# Altium footprint library RF Module.PcbLib: 16 footprints
Each footprint in its own frame and in the unit in brackets; x right, y up, seen from the top. Pads: shape width x height; smd on the part's side, far side on the other; paste and mask are expansions set on the pad; w line width, h text height; cw(c..) or ccw(c..) is an arc to the next point about the centre after c.
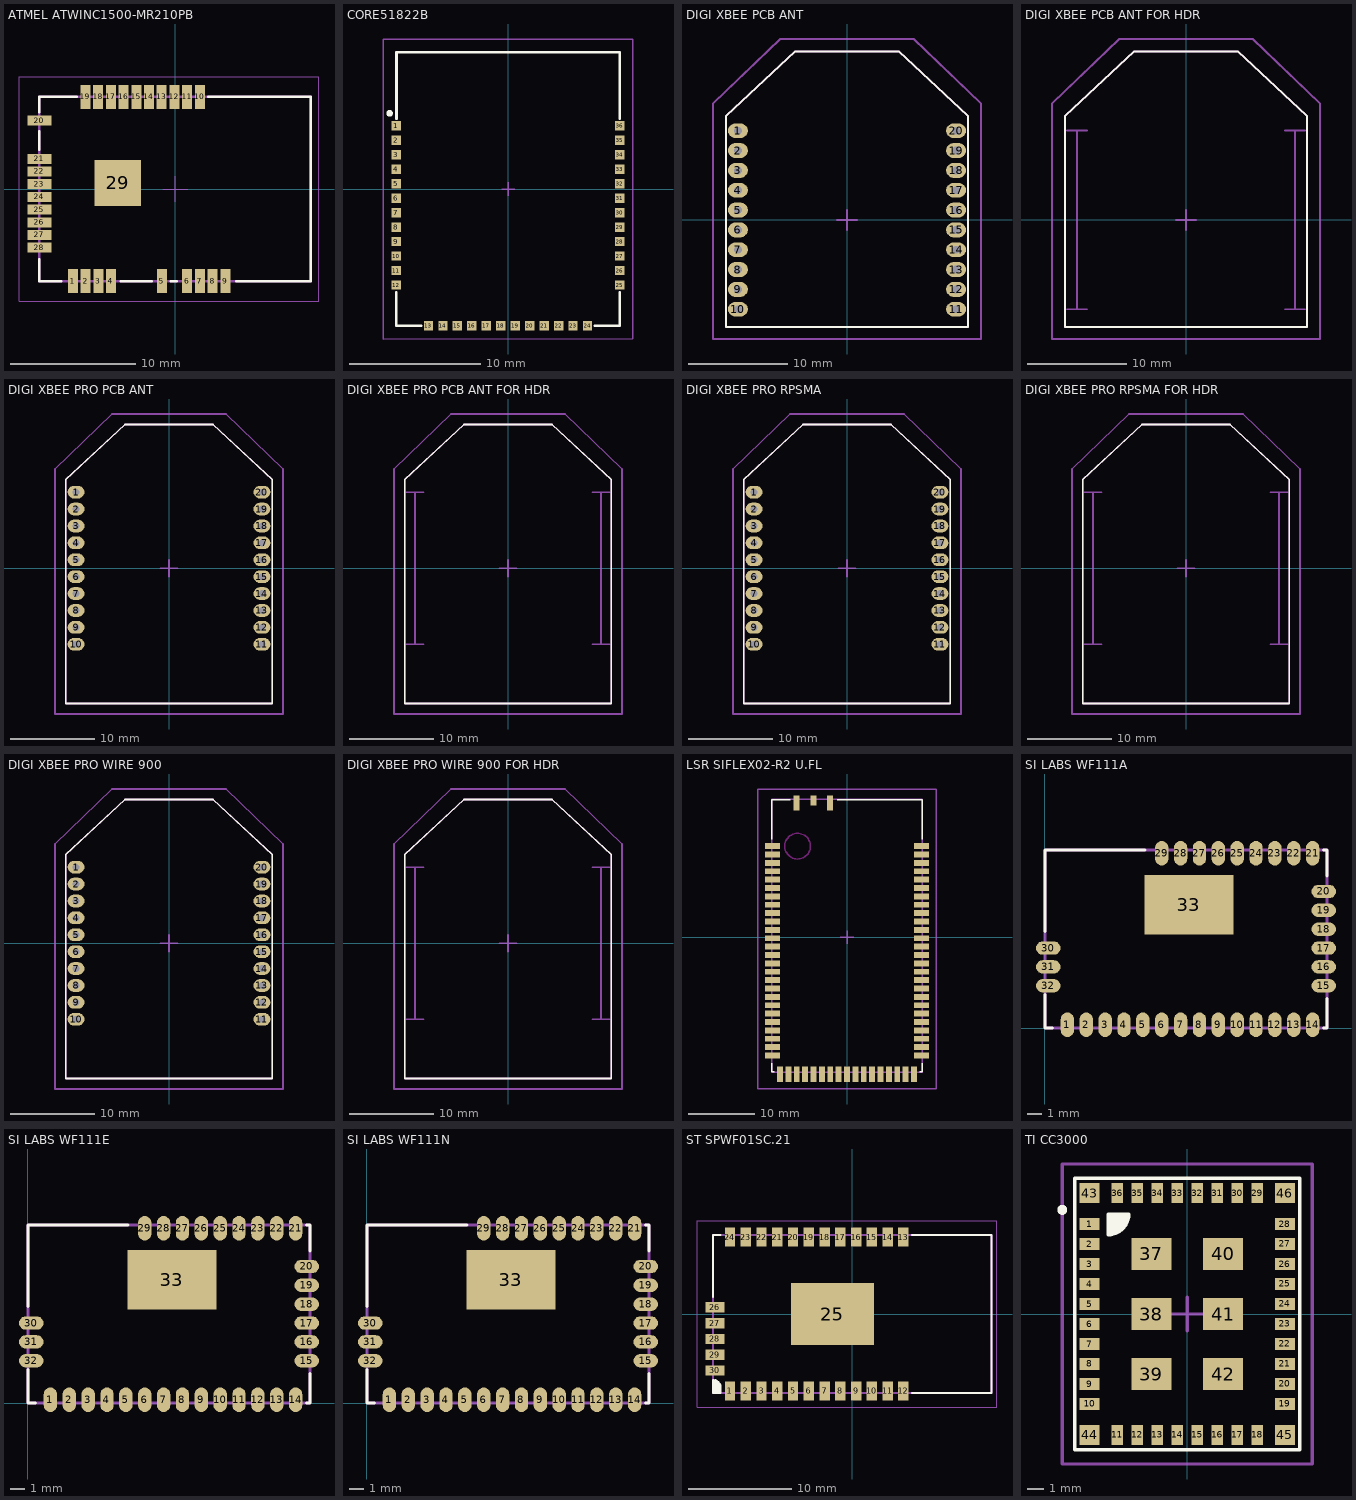
[diagram p0: the footprints below, top view; thin cyan lines are the x and y axes]

## ATMEL ATWINC1500-MR210PB [mm]
height 2.2
pads (29):
  rect 0.8x1.9 smd: 1(-8.19,-7.365) 2(-7.174,-7.365) 3(-6.158,-7.365) 4(-5.142,-7.365) 5(-1.078,-7.365) 6(0.954,-7.365) 7(1.97,-7.365) 8(2.986,-7.365) 9(4.002,-7.365) 10(1.964,7.365) 11(0.948,7.365) 12(-0.068,7.365) 13(-1.084,7.365) 14(-2.1,7.365) 15(-3.116,7.365) 16(-4.132,7.365) 17(-5.148,7.365) 18(-6.164,7.365) 19(-7.18,7.365)
  rect 1.9x0.8 smd: 20(-10.86,5.465) 21(-10.86,2.417) 22(-10.86,1.401) 23(-10.86,0.385) 24(-10.86,-0.631) 25(-10.86,-1.647) 26(-10.86,-2.663) 27(-10.86,-3.679) 28(-10.86,-4.695)
  rect 3.7x3.7 smd: 29(-4.59,0.485)
Top Overlay:
  lines w0.2: -10.86,-5.615 -10.86,-7.365 -9.11,-7.365 ; -10.86,3.135 -10.86,4.635 ; -10.86,6.135 -10.86,7.365 -7.86,7.365 ; -4.36,-7.365 -1.86,-7.365 ; -0.36,-7.365 0.14,-7.365 ; 2.64,7.365 10.86,7.365 10.86,-7.365 4.89,-7.365
Mechanical 1:
  lines w0.2: -10.86,-7.365 10.86,-7.365 10.86,7.365 -10.86,7.365 -10.86,-7.365
Mechanical 15:
  lines w0.1: -1,0 1,0 ; 0,-1 0,1 ; -12.5,-9 -12.5,9 11.5,9 11.5,-9 -12.5,-9
3D body "ATWINC1500-MR210PB.STEP": height 2.2, standoff 0, extent -10.86,-7.365 10.86,7.365

## CORE51822B [mm] "BLE4.0 Bluetooth 2.4G Wireless Module"
height 3
pads (36):
  rect 0.7x0.7 smd: 1(-8.525,4.8) 2(-8.525,3.7) 3(-8.525,2.6) 4(-8.525,1.5) 5(-8.525,0.4) 6(-8.525,-0.7) 7(-8.525,-1.8) 8(-8.525,-2.9) 9(-8.525,-4) 10(-8.525,-5.1) 11(-8.525,-6.2) 12(-8.525,-7.3) 13(-6.075,-10.4) 14(-4.975,-10.4) 15(-3.875,-10.4) 16(-2.775,-10.4) 17(-1.675,-10.4) 18(-0.575,-10.4) 19(0.525,-10.4) 20(1.625,-10.4) 21(2.725,-10.4) 22(3.825,-10.4) 23(4.925,-10.4) 24(6.025,-10.4) 25(8.475,-7.3) 26(8.475,-6.2) 27(8.475,-5.1) 28(8.475,-4) 29(8.475,-2.9) 30(8.475,-1.8) 31(8.475,-0.7) 32(8.475,0.4) 33(8.475,1.5) 34(8.475,2.6) 35(8.475,3.7) 36(8.475,4.8)
Top Overlay:
  circle w0.254: c-9.025,5.75 r0.125
  lines w0.2: -8.525,-7.85 -8.525,-10.4 -6.625,-10.4 ; -8.5,5.35 -8.5,10.4 8.475,10.4 8.475,5.35 ; 6.575,-10.4 8.475,-10.4 8.475,-7.85
Mechanical 15:
  lines w0.1: -0.5,0 0.5,0 ; 0,-0.5 0,0.5 ; -9.525,-11.4 9.475,-11.4 9.475,11.4 -9.525,11.4 -9.525,-11.4
3D body: height 2.5, standoff 0, extent -8.525,-10.4 8.475,10.4

## DIGI XBEE PCB ANT [mm]
height 4
pads (20):
  oval 2x1.5 hole 0.8: 1(-11,9) 2(-11,7) 3(-11,5) 4(-11,3) 5(-11,1) 6(-11,-1) 7(-11,-3) 8(-11,-5) 9(-11,-7) 10(-11,-9) 11(11,-9) 12(11,-7) 13(11,-5) 14(11,-3) 15(11,-1) 16(11,1) 17(11,3) 18(11,5) 19(11,7) 20(11,9)
Top Overlay:
  lines w0.2: -12.2,-10.8 0,-10.8 12.2,-10.8 12.2,10.5 5.2,17 0,17 -5.2,17 -12.2,10.5 -12.2,-10.8
Mechanical 1:
  lines w0.2: -12.2,-10.8 -12.2,10.5 -5.2,17 0,17 5.2,17 12.2,10.5 12.2,-10.8 0,-10.8 -12.2,-10.8
Mechanical 15:
  lines w0.2: -1,0 1,0 ; 0,-1 0,1 ; -13.5,-12 -13.5,11.75 -6.75,18.25 6.75,18.25 13.5,11.75 13.5,-12 -13.5,-12
3D body "XBee PCB Antenna.STEP": height 3.58, standoff -4.17, extent -12.192,-10.8 12.192,16.97

## DIGI XBEE PCB ANT FOR HDR [mm]
height 8.4
Top Overlay:
  lines w0.2: -12.2,-10.8 0,-10.8 12.2,-10.8 12.2,10.5 5.2,17 0,17 -5.2,17 -12.2,10.5 -12.2,-10.8
Mechanical 1:
  lines w0.2: -12,-9 -11,-9 ; -12,9 -11,9 ; -10,-9 -11,-9 ; -10,9 -11,9 ; 10,-9 11,-9 ; 10,9 11,9 ; 12,-9 11,-9 ; 12,9 11,9 ; -11,-9 -11,9 ; 11,-9 11,9 ; -12.2,-10.8 -12.2,10.5 -5.2,17 0,17 5.2,17 12.2,10.5 12.2,-10.8 0,-10.8 -12.2,-10.8
Mechanical 15:
  lines w0.2: -1,0 1,0 ; 0,-1 0,1 ; -13.5,-12 -13.5,11.75 -6.75,18.25 6.75,18.25 13.5,11.75 13.5,-12 -13.5,-12
3D body "XBee PCB Antenna.STEP": height 7.98, standoff 0.23, extent -12.192,-10.8 12.192,16.97

## DIGI XBEE PRO PCB ANT [mm]
height 4
pads (20):
  oval 2x1.5 hole 0.8: 1(-11,9) 2(-11,7) 3(-11,5) 4(-11,3) 5(-11,1) 6(-11,-1) 7(-11,-3) 8(-11,-5) 9(-11,-7) 10(-11,-9) 11(11,-9) 12(11,-7) 13(11,-5) 14(11,-3) 15(11,-1) 16(11,1) 17(11,3) 18(11,5) 19(11,7) 20(11,9)
Top Overlay:
  lines w0.2: -12.2,-16 -12.2,10.5 -5.2,17 0,17 5.2,17 12.2,10.5 12.2,-16 -12.2,-16
Mechanical 1:
  lines w0.2: -12.2,-16 12.2,-16 12.2,10.5 5.2,17 0,17 -5.2,17 -12.2,10.5 -12.2,-16
Mechanical 15:
  lines w0.2: -1,0 1,0 ; 0,-1 0,1 ; -13.5,-17.25 13.5,-17.25 13.5,11.75 6.75,18.25 -6.75,18.25 -13.5,11.75 -13.5,-17.25
3D body "XBee Pro PCB Antenna.STEP": height 3.58, standoff -4.17, extent -12.192,-15.97 12.192,16.97

## DIGI XBEE PRO PCB ANT FOR HDR [mm]
height 4
Top Overlay:
  lines w0.2: -12.2,-16 -12.2,10.5 -5.2,17 0,17 5.2,17 12.2,10.5 12.2,-16 -12.2,-16
Mechanical 1:
  lines w0.2: -12,-9 -11,-9 ; -12,9 -11,9 ; -10,-9 -11,-9 ; -10,9 -11,9 ; 10,-9 11,-9 ; 10,9 11,9 ; 12,-9 11,-9 ; 12,9 11,9 ; -11,-9 -11,9 ; 11,-9 11,9 ; -12.2,-16 12.2,-16 12.2,10.5 5.2,17 0,17 -5.2,17 -12.2,10.5 -12.2,-16
Mechanical 15:
  lines w0.2: -1,0 1,0 ; 0,-1 0,1 ; -13.5,-17.25 13.5,-17.25 13.5,11.75 6.75,18.25 -6.75,18.25 -13.5,11.75 -13.5,-17.25
3D body "XBee Pro PCB Antenna.STEP": height 3.58, standoff -4.17, extent -12.192,-15.97 12.192,16.97

## DIGI XBEE PRO RPSMA [mm]
height 4
pads (20):
  oval 2x1.5 hole 0.8: 1(-11,9) 2(-11,7) 3(-11,5) 4(-11,3) 5(-11,1) 6(-11,-1) 7(-11,-3) 8(-11,-5) 9(-11,-7) 10(-11,-9) 11(11,-9) 12(11,-7) 13(11,-5) 14(11,-3) 15(11,-1) 16(11,1) 17(11,3) 18(11,5) 19(11,7) 20(11,9)
Top Overlay:
  lines w0.2: -12.2,-16 12.2,-16 12.2,10.5 5.2,17 0,17 -5.2,17 -12.2,10.5 -12.2,-16
Mechanical 1:
  lines w0.2: -12.2,-16 -12.2,10.5 -5.2,17 0,17 5.2,17 12.2,10.5 12.2,-16 -12.2,-16
Mechanical 15:
  lines w0.2: -1,0 1,0 ; 0,-1 0,1 ; -13.5,-17.25 -13.5,11.75 -6.75,18.25 6.75,18.25 13.5,11.75 13.5,-17.25 -13.5,-17.25
3D body "XBee Pro wRPSMA.STEP": height 7.27, standoff -4.17, extent -12.192,-15.97 12.192,29.97

## DIGI XBEE PRO RPSMA FOR HDR [mm]
height 12.4
Top Overlay:
  lines w0.2: -12.2,-16 -12.2,10.5 -5.2,17 0,17 5.2,17 12.2,10.5 12.2,-16 -12.2,-16
Mechanical 1:
  lines w0.2: -12,-9 -11,-9 ; -12,9 -11,9 ; -10,-9 -11,-9 ; -10,9 -11,9 ; 10,-9 11,-9 ; 10,9 11,9 ; 12,-9 11,-9 ; 12,9 11,9 ; -11,-9 -11,9 ; 11,-9 11,9 ; -12.2,-16 12.2,-16 12.2,10.5 5.2,17 0,17 -5.2,17 -12.2,10.5 -12.2,-16
Mechanical 15:
  lines w0.2: -1,0 1,0 ; 0,-1 0,1 ; -13.5,-17.25 13.5,-17.25 13.5,11.75 6.75,18.25 -6.75,18.25 -13.5,11.75 -13.5,-17.25
3D body "XBee Pro wRPSMA.STEP": height 11.67, standoff 0.23, extent -12.192,-15.97 12.192,29.97

## DIGI XBEE PRO WIRE 900 [mm]
height 4
pads (20):
  oval 2x1.5 hole 0.8: 1(-11,9) 2(-11,7) 3(-11,5) 4(-11,3) 5(-11,1) 6(-11,-1) 7(-11,-3) 8(-11,-5) 9(-11,-7) 10(-11,-9) 11(11,-9) 12(11,-7) 13(11,-5) 14(11,-3) 15(11,-1) 16(11,1) 17(11,3) 18(11,5) 19(11,7) 20(11,9)
Top Overlay:
  lines w0.2: -12.2,-16 -12.2,10.5 -5.2,17 0,17 5.2,17 12.2,10.5 12.2,-16 -12.2,-16
Mechanical 1:
  lines w0.2: -12.2,-16 12.2,-16 12.2,10.5 5.2,17 0,17 -5.2,17 -12.2,10.5 -12.2,-16
Mechanical 15:
  lines w0.2: -1,0 1,0 ; 0,-1 0,1 ; -13.5,-17.25 13.5,-17.25 13.5,11.75 6.75,18.25 -6.75,18.25 -13.5,11.75 -13.5,-17.25
3D body "XBee Pro Wire 900.STEP": height 77.88, standoff -4.17, extent -12.192,-15.97 12.192,16.97

## DIGI XBEE PRO WIRE 900 FOR HDR [mm]
height 8.4
Top Overlay:
  lines w0.2: -12.2,-16 -12.2,10.5 -5.2,17 0,17 5.2,17 12.2,10.5 12.2,-16 -12.2,-16
Mechanical 1:
  lines w0.2: -12,-9 -11,-9 ; -12,9 -11,9 ; -10,-9 -11,-9 ; -10,9 -11,9 ; 10,-9 11,-9 ; 10,9 11,9 ; 12,-9 11,-9 ; 12,9 11,9 ; -11,-9 -11,9 ; 11,-9 11,9 ; -12.2,-16 12.2,-16 12.2,10.5 5.2,17 0,17 -5.2,17 -12.2,10.5 -12.2,-16
Mechanical 15:
  lines w0.2: -1,0 1,0 ; 0,-1 0,1 ; -13.5,-17.25 13.5,-17.25 13.5,11.75 6.75,18.25 -6.75,18.25 -13.5,11.75 -13.5,-17.25
3D body "XBee Pro Wire 900.STEP": height 82.28, standoff 0.23, extent -12.192,-15.97 12.192,16.97

## LSR SIFLEX02-R2 U.FL [mil]
height 200.79
pads (72):
  rect 90x35 smd: 1(-445,544.51) 2(-445,494.51) 3(-445,444.51) 4(-445,394.51) 5(-445,344.51) 6(-445,294.51) 7(-445,244.51) 8(-445,194.51) 9(-445,144.51) 10(-445,94.51) 11(-445,44.51) 12(-445,-5.49) 13(-445,-55.49) 14(-445,-105.49) 15(-445,-155.49) 16(-445,-205.49) 17(-445,-255.49) 18(-445,-305.49) 19(-445,-355.49) 20(-445,-405.49) 21(-445,-455.49) 22(-445,-505.49) 23(-445,-555.49) 24(-445,-605.49) 25(-445,-655.49) 26(-445,-705.49) 44(445,-705.49) 45(445,-655.49) 46(445,-605.49) 47(445,-555.49) 48(445,-505.49) 49(445,-455.49) 50(445,-405.49) 51(445,-355.49) 52(445,-305.49) 53(445,-255.49) 54(445,-205.49) 55(445,-155.49) 56(445,-105.49) 57(445,-55.49) 58(445,-5.49) 59(445,44.51) 60(445,94.51) 61(445,144.51) 62(445,194.51) 63(445,244.51) 64(445,294.51) 65(445,344.51) 66(445,394.51) 67(445,444.51) 68(445,494.51) 69(445,544.51)
  rect 35x90 smd: 27(-400,-817.49) 28(-350,-817.49) 29(-300,-817.49) 30(-250,-817.49) 31(-200,-817.49) 32(-150,-817.49) 33(-100,-817.49) 34(-50,-817.49) 35(0,-817.49) 36(50,-817.49) 37(100,-817.49) 38(150,-817.49) 39(200,-817.49) 40(250,-817.49) 41(300,-817.49) 42(350,-817.49) 43(400,-817.49) 70(-100.5,802.51) 72(-300.5,802.49)
  rect 35x60 smd: 71(-200.5,817.49)
Top Overlay:
  lines w7.87: -448.82,-752.51 -448.82,-803.69 -433.07,-803.69 ; -448.82,586.07 -448.82,822.29 -338.58,822.29 ; -59.06,822.29 448.82,822.29 448.82,586.07 ; 433.07,-803.69 448.82,-803.69 448.82,-752.51
Keep-Out Layer:
  circle w7.87: c-295,544.51 r76.87
Mechanical 1:
  lines w7.87: -450,-804.71 450,-804.71 450,825.29 -450,825.29 -450,-804.71
Mechanical 15:
  lines w7.87: -39.37,0 39.37,0 ; 0,-39.37 0,39.37 ; -531.5,-905.51 531.5,-905.51 531.5,885.83 -531.5,885.83 -531.5,-905.51
3D body "LSR SIFlex02-R2 450-0016-R1.STEP": height 176.7, standoff -0.5, extent -450,-804.71 450,825.29

## SI LABS WF111A [mm]
height 2.1
pads (33):
  oval 0.9x1.65 smd: 1(1.515,0.225) 2(2.785,0.225) 3(4.055,0.225) 4(5.325,0.225) 5(6.595,0.225) 6(7.865,0.225) 7(9.135,0.225) 8(10.405,0.225) 9(11.675,0.225) 10(12.945,0.225) 11(14.215,0.225) 12(15.485,0.225) 13(16.755,0.225) 14(18.025,0.225) 21(18.025,11.775) 22(16.755,11.775) 23(15.485,11.775) 24(14.215,11.775) 25(12.945,11.775) 26(11.675,11.775) 27(10.405,11.775) 28(9.135,11.775) 29(7.865,11.775)
  oval 1.65x0.9 smd: 15(18.775,2.85) 16(18.775,4.12) 17(18.775,5.39) 18(18.775,6.66) 19(18.775,7.93) 20(18.775,9.2) 30(0.225,5.39) 31(0.225,4.12) 32(0.225,2.85)
  rect 6x4 smd: 33(9.7,8.3)
Top Overlay:
  lines w0.2: 0,2.25 0,0 0.5,0 ; 0,6.5 0,12 6.75,12 ; 18.75,0 19,0 19,2 ; 18.75,12 19,12 19,10.25
Mechanical 1:
  lines w0.2: 0,0 0,12 19,12 19,0 0,0
3D body "WF111A.STEP": height 2.1, standoff 0, extent 0,0 19,12

## SI LABS WF111E [mm]
height 2.1
pads (33):
  oval 0.9x1.65 smd: 1(1.515,0.225) 2(2.785,0.225) 3(4.055,0.225) 4(5.325,0.225) 5(6.595,0.225) 6(7.865,0.225) 7(9.135,0.225) 8(10.405,0.225) 9(11.675,0.225) 10(12.945,0.225) 11(14.215,0.225) 12(15.485,0.225) 13(16.755,0.225) 14(18.025,0.225) 21(18.025,11.775) 22(16.755,11.775) 23(15.485,11.775) 24(14.215,11.775) 25(12.945,11.775) 26(11.675,11.775) 27(10.405,11.775) 28(9.135,11.775) 29(7.865,11.775)
  oval 1.65x0.9 smd: 15(18.775,2.85) 16(18.775,4.12) 17(18.775,5.39) 18(18.775,6.66) 19(18.775,7.93) 20(18.775,9.2) 30(0.225,5.39) 31(0.225,4.12) 32(0.225,2.85)
  rect 6x4 smd: 33(9.7,8.3)
Top Overlay:
  lines w0.2: 0,2.25 0,0 0.5,0 ; 0,6.5 0,12 6.75,12 ; 18.75,0 19,0 19,2 ; 18.75,12 19,12 19,10.25
Mechanical 1:
  lines w0.2: 0,0 19,0 19,12 0,12 0,0
3D body "WF111E.STEP": height 2.2, standoff 0, extent 0,0 19,12

## SI LABS WF111N [mm]
height 2.1
pads (33):
  oval 0.9x1.65 smd: 1(1.515,0.225) 2(2.785,0.225) 3(4.055,0.225) 4(5.325,0.225) 5(6.595,0.225) 6(7.865,0.225) 7(9.135,0.225) 8(10.405,0.225) 9(11.675,0.225) 10(12.945,0.225) 11(14.215,0.225) 12(15.485,0.225) 13(16.755,0.225) 14(18.025,0.225) 21(18.025,11.775) 22(16.755,11.775) 23(15.485,11.775) 24(14.215,11.775) 25(12.945,11.775) 26(11.675,11.775) 27(10.405,11.775) 28(9.135,11.775) 29(7.865,11.775)
  oval 1.65x0.9 smd: 15(18.775,2.85) 16(18.775,4.12) 17(18.775,5.39) 18(18.775,6.66) 19(18.775,7.93) 20(18.775,9.2) 30(0.225,5.39) 31(0.225,4.12) 32(0.225,2.85)
  rect 6x4 smd: 33(9.7,8.3)
Top Overlay:
  lines w0.2: 0,2.25 0,0 0.5,0 ; 0,6.5 0,12 6.75,12 ; 18.75,0 19,0 19,2 ; 18.75,12 19,12 19,10.25
Mechanical 1:
  lines w0.2: 0,0 19,0 19,12 0,12 0,0
3D body "WF111N.STEP": height 2.1, standoff 0, extent 0,0 19,12

## ST SPWF01SC.21 [mm] "Serial to WiFi b/g/n intelligent modules"
height 2.35
pads (30):
  rect 1x1.85 smd: 1(-11.811,-7.435) 2(-10.287,-7.435) 3(-8.763,-7.435) 4(-7.239,-7.435) 5(-5.715,-7.435) 6(-4.191,-7.435) 7(-2.667,-7.435) 8(-1.143,-7.435) 9(0.381,-7.435) 10(1.905,-7.435) 11(3.429,-7.435) 12(4.953,-7.435) 13(4.953,7.435) 14(3.429,7.435) 15(1.905,7.435) 16(0.381,7.435) 17(-1.143,7.435) 18(-2.667,7.435) 19(-4.191,7.435) 20(-5.715,7.435) 21(-7.239,7.435) 22(-8.763,7.435) 23(-10.287,7.435) 24(-11.811,7.435)
  rect 8x6 smd: 25(-1.911,0)
  rect 1.85x1 smd: 26(-13.277,0.636) 27(-13.277,-0.888) 28(-13.277,-2.412) 29(-13.277,-3.936) 30(-13.277,-5.46)
Top Overlay:
  region: -13.462,-7.62 -13.462,-6.37 -13.13,-6.37 -12.712,-6.788 -12.712,-7.62
  lines w0.2: -13.462,1.63 -13.462,7.62 -12.712,7.62 ; 5.788,-7.62 13.462,-7.62 13.462,7.62 5.788,7.62 ; -13.462,-7.62 -13.462,-6.37 cw(c-13.462,-7.12) -12.712,-7.12 -12.712,-7.62 -13.462,-7.62
Mechanical 1:
  lines w0.2: -13.462,-7.62 -13.462,7.62 13.462,7.62 13.462,-7.62 -13.462,-7.62
Mechanical 15:
  lines w0.1: -1,0 1,0 ; 0,-1 0,1 ; -15,-9 14,-9 14,9 -15,9 -15,-9
3D body "SPWF01SC.21.STEP": height 2.6, standoff -0.03, extent -13.462,-7.62 13.462,7.62

## TI CC3000 [mm]
height 2.2
pads (46):
  rect 1.2x0.7 smd: 1(-5.85,5.4) 2(-5.85,4.2) 3(-5.85,3) 4(-5.85,1.8) 5(-5.85,0.6) 6(-5.85,-0.6) 7(-5.85,-1.8) 8(-5.85,-3) 9(-5.85,-4.2) 10(-5.85,-5.4) 19(5.85,-5.4) 20(5.85,-4.2) 21(5.85,-3) 22(5.85,-1.8) 23(5.85,-0.6) 24(5.85,0.6) 25(5.85,1.8) 26(5.85,3) 27(5.85,4.2) 28(5.85,5.4)
  rect 0.7x1.2 smd: 11(-4.2,-7.25) 12(-3,-7.25) 13(-1.8,-7.25) 14(-0.6,-7.25) 15(0.6,-7.25) 16(1.8,-7.25) 17(3,-7.25) 18(4.2,-7.25) 29(4.2,7.25) 30(3,7.25) 31(1.8,7.25) 32(0.6,7.25) 33(-0.6,7.25) 34(-1.8,7.25) 35(-3,7.25) 36(-4.2,7.25)
  rect 2.4x1.9 smd: 37(-2.15,3.6) 38(-2.15,0) 39(-2.15,-3.6) 40(2.15,3.6) 41(2.15,0) 42(2.15,-3.6)
  rect 1.2x1.2 smd: 43(-5.85,7.25) 44(-5.85,-7.25) 45(5.85,-7.25) 46(5.85,7.25)
Top Overlay:
  circle w0.3: c-7.5,6.25 r0.15
  region: -4.75,6 -4.75,4.75 -4.25,4.75 -3.5,5.5 -3.5,6
  lines w0.2: -6.75,-8.15 -6.75,8.15 6.75,8.15 6.75,-8.15 -6.75,-8.15 ; -4.75,4.75 ccw(c-4.75,6) -3.5,6 -4.75,6 -4.75,4.75
Mechanical 15:
  lines w0.2: -1,0 1,0 ; 0,-1 0,1 ; -7.5,-9 7.5,-9 7.5,9 -7.5,9 -7.5,-9
3D body "TI CC3000MOD.STEP": height 2.1, standoff 0, extent -6.75,-8.15 6.75,8.15